# Altium footprint library connectors_headers.PcbLib: 60 footprints (part 2 of 4)
Each footprint in its own frame and in the unit in brackets; x right, y up, seen from the top. Pads: shape width x height; smd on the part's side, far side on the other; paste and mask are expansions set on the pad; w line width, h text height; cw(c..) or ccw(c..) is an arc to the next point about the centre after c.
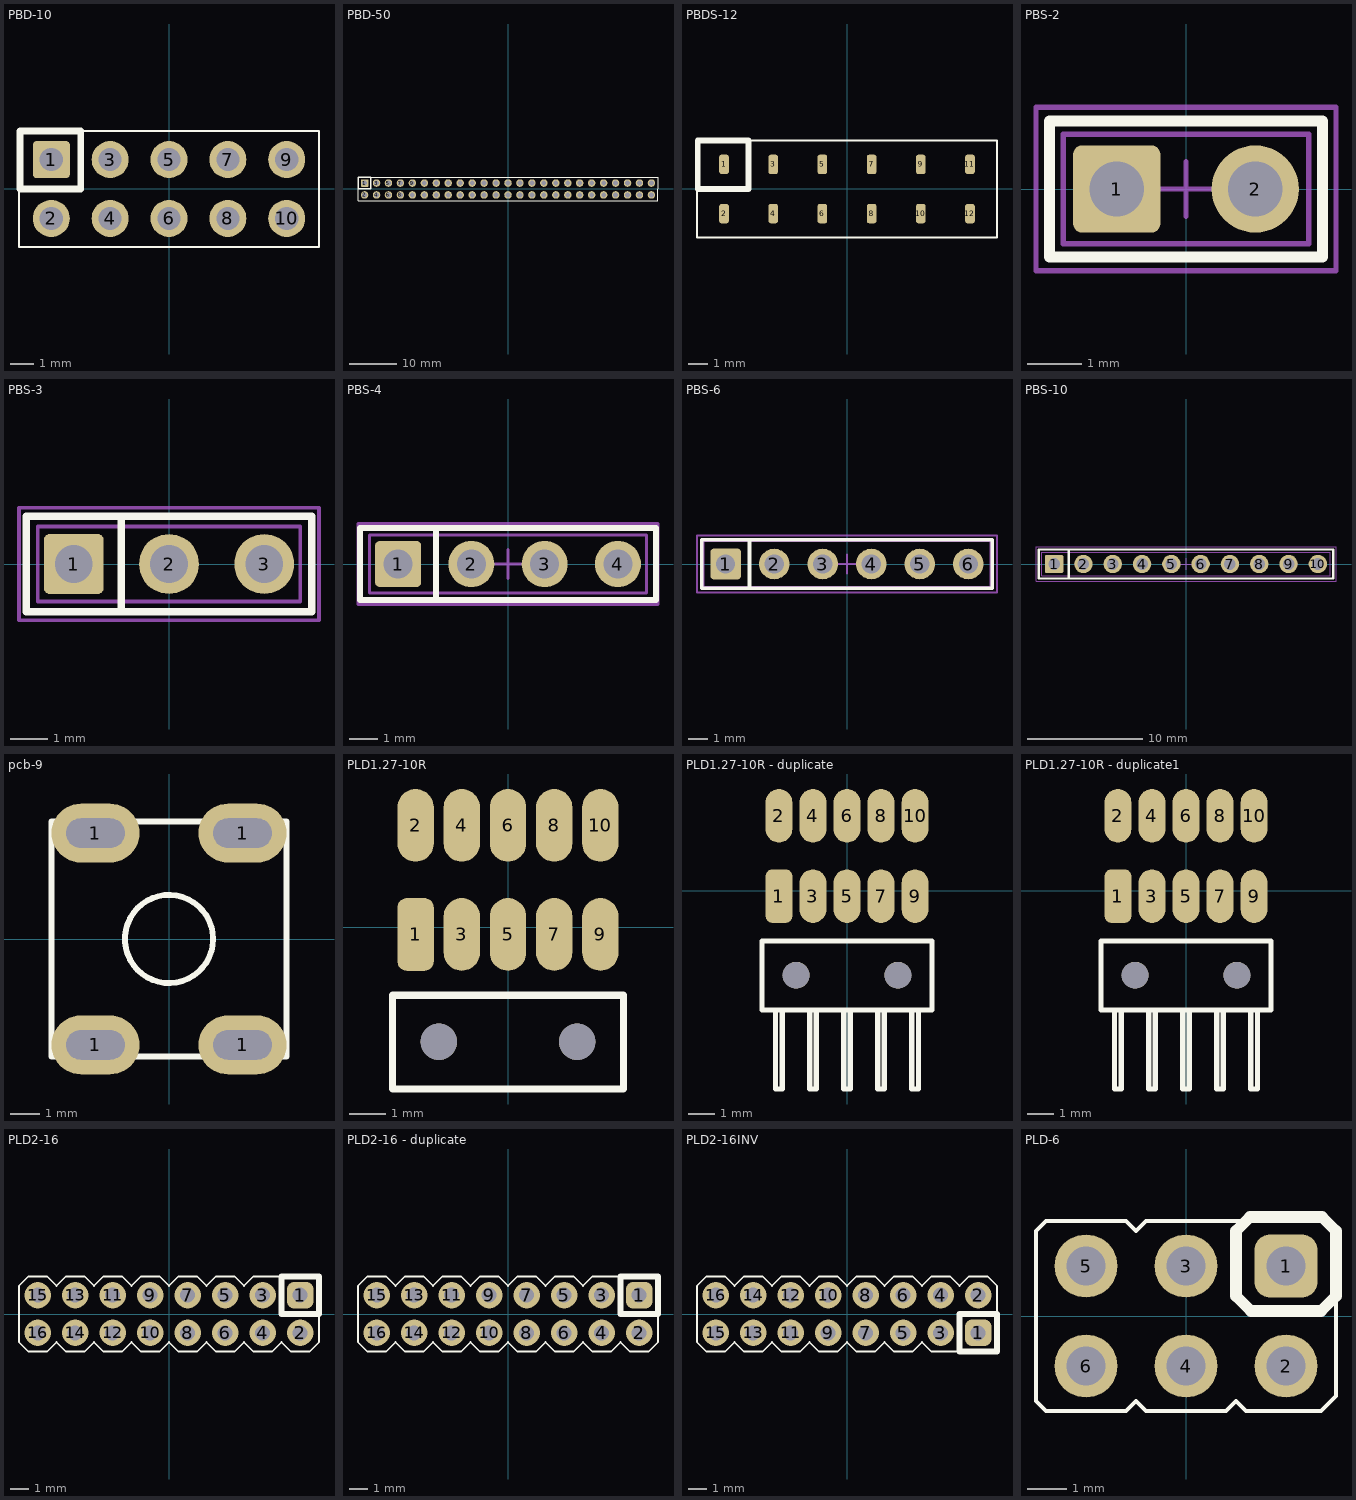
[diagram p1: the footprints below, top view; thin cyan lines are the x and y axes]

## PBD-10 [mm]
height 0.025
pads (10):
  rrect20% 1.6x1.6 hole 1 mask+0.127: 1(-5.08,1.27)
  round 1.6 hole 1 mask+0.127: 2(-5.08,-1.27) 3(-2.54,1.27) 4(-2.54,-1.27) 5(0,1.27) 6(0,-1.27) 7(2.54,1.27) 8(2.54,-1.27) 9(5.08,1.27) 10(5.08,-1.27)
Top Overlay:
  lines w0.1: -6.475,0 -6.475,-2.5 6.475,-2.5 6.475,2.5 -3.81,2.5
  lines w0.3: -6.44,0 -6.44,2.5 -3.81,2.5 -3.81,0 -6.44,0
3D body "PBD2_54-10.step": height 8.4, standoff -2.7, extent -6.35,-2.54 6.35,2.54

## PBD-50 [mm]
height 0.025
pads (50):
  rrect20% 1.6x1.6 hole 1 mask+0.127: 1(-30.48,1.27)
  round 1.6 hole 1 mask+0.127: 2(-30.48,-1.27) 3(-27.94,1.27) 4(-27.94,-1.27) 5(-25.4,1.27) 6(-25.4,-1.27) 7(-22.86,1.27) 8(-22.86,-1.27) 9(-20.32,1.27) 10(-20.32,-1.27) 11(-17.78,1.27) 12(-17.78,-1.27) 13(-15.24,1.27) 14(-15.24,-1.27) 15(-12.7,1.27) 16(-12.7,-1.27) 17(-10.16,1.27) 18(-10.16,-1.27) 19(-7.62,1.27) 20(-7.62,-1.27) 21(-5.08,1.27) 22(-5.08,-1.27) 23(-2.54,1.27) 24(-2.54,-1.27) 25(0,1.27) 26(0,-1.27) 27(2.54,1.27) 28(2.54,-1.27) 29(5.08,1.27) 30(5.08,-1.27) 31(7.62,1.27) 32(7.62,-1.27) 33(10.16,1.27) 34(10.16,-1.27) 35(12.7,1.27) 36(12.7,-1.27) 37(15.24,1.27) 38(15.24,-1.27) 39(17.78,1.27) 40(17.78,-1.27) 41(20.32,1.27) 42(20.32,-1.27) 43(22.86,1.27) 44(22.86,-1.27) 45(25.4,1.27) 46(25.4,-1.27) 47(27.94,1.27) 48(27.94,-1.27) 49(30.48,1.27) 50(30.48,-1.27)
Top Overlay:
  lines w0.1: -31.875,0 -31.875,-2.5 31.875,-2.5 31.875,2.5 -29.21,2.5 ; -6.35,2.5 3.935,2.5
  lines w0.3: -31.84,0 -29.21,0 -29.21,2.5 -31.84,2.5 -31.84,0
3D body "PBD2_54-10.step": height 8.4, standoff -2.7, extent 19.05,-2.54 31.75,2.54
3D body "PBD2_54-10.step": height 8.4, standoff -2.7, extent 6.35,-2.54 19.05,2.54
3D body "PBD2_54-10.step": height 8.4, standoff -2.7, extent -6.35,-2.54 6.35,2.54
3D body "PBD2_54-10.step": height 8.4, standoff -2.7, extent -19.05,-2.54 -6.35,2.54
3D body "PBD2_54-10.step": height 8.4, standoff -2.7, extent -31.75,-2.54 -19.05,2.54

## PBDS-12 [mm]
height 0.025
pads (12):
  rrect50% 0.5x1 all layers, no hole mask+0.127: 1(-6.35,1.27) 2(-6.35,-1.27) 3(-3.81,1.27) 4(-3.81,-1.27) 5(-1.27,1.27) 6(-1.27,-1.27) 7(1.27,1.27) 8(1.27,-1.27) 9(3.81,1.27) 10(3.81,-1.27) 11(6.35,1.27) 12(6.35,-1.27)
Top Overlay:
  lines w0.1: -7.745,0 -7.745,-2.5 7.745,-2.5 7.745,2.5 -5.08,2.5
  lines w0.3: -7.71,0 -5.08,0 -5.08,2.5 -7.71,2.5 -7.71,0

## PBS-2 [mm] "PBS-3 2.54"
height 0.025
pads (2):
  rrect20% 1.6x1.6 hole 1: 1(-1.27,0)
  round 1.6 hole 1: 2(1.27,0)
Top Overlay:
  lines w0.2: -2.5,-1.25 -2.5,1.25 2.5,1.25 2.5,-1.25 -2.5,-1.25
M3_comm_top:
  text ".comment" at -0.9,-0.3 h1
M5_asm_top:
  lines w0.1: -2.25,-1 2.25,-1 2.25,1 -2.25,1 -2.25,-1
  text ".Designator" at -1.5,1.25 h1
M7_courtyard_top:
  lines w0.1: -0.5,0 0.5,0 ; 0,-0.5 0,0.5 ; -2.75,-1.5 -2.75,1.5 2.75,1.5 2.75,-1.5 -2.75,-1.5
3D body "User Library-PBS-02.STEP": height 8.44, standoff -3.16, extent -2.54,-1.27 2.54,1.27

## PBS-3 [mm] "PBS-3 2.54"
height 0.025
pads (3):
  rrect20% 1.6x1.6 hole 1: 1(-2.54,0)
  round 1.6 hole 1: 2(0,0) 3(2.54,0)
Top Overlay:
  lines w0.2: -1.27,-1.27 -1.27,1.27 ; -3.81,-1.27 3.81,-1.27 3.81,1.27 -3.81,1.27 -3.81,-1.27
M3_comm_top:
  text ".comment" at -0.9,-0.3 h1
M5_asm_top:
  lines w0.1: -3.5,-1 3.5,-1 3.5,1 -3.5,1 -3.5,-1
  text ".Designator" at -1,1.3 h1
M7_courtyard_top:
  lines w0.1: -0.5,0 0.5,0 ; 0,-0.5 0,0.5 ; -4,-1.5 4,-1.5 4,1.5 -4,1.5 -4,-1.5
3D body "User Library-PBS-03.step": height 8.45, standoff -3.15, extent -3.81,-1.27 3.81,1.27

## PBS-4 [mm] "PBS-3 2.54"
height 0.025
pads (4):
  rrect20% 1.6x1.6 hole 1: 1(-3.81,0)
  round 1.6 hole 1: 2(-1.27,0) 3(1.27,0) 4(3.81,0)
Top Overlay:
  lines w0.2: -2.5,-1.2 -2.5,1.2 ; -5.13,-1.25 5.13,-1.25 5.13,1.25 -5.13,1.25 -5.13,-1.25
M3_comm_top:
  text ".comment" at -1.25,-0.3 h1
M5_asm_top:
  lines w0.1: -4.8,-1 4.8,-1 4.8,1 -4.8,1 -4.8,-1
  text ".Designator" at -1,1.3 h1
M7_courtyard_top:
  lines w0.1: -0.5,0 0.5,0 ; 0,-0.5 0,0.5 ; -5.2,-1.4 5.2,-1.4 5.2,1.4 -5.2,1.4 -5.2,-1.4
3D body "User Library-PBS-04.step": height 8.4, standoff -3.2, extent -5.075,-1.265 5.085,1.275

## PBS-6 [mm] "PBS-3 2.54"
height 0.025
pads (6):
  rrect20% 1.6x1.6 hole 1: 1(-6.35,0)
  round 1.6 hole 1: 2(-3.81,0) 3(-1.27,0) 4(1.27,0) 5(3.81,0) 6(6.35,0)
Top Overlay:
  lines w0.2: -5.1,-1.27 -5.1,1.27 ; -7.6,-1.27 7.6,-1.27 7.6,1.27 -7.6,1.27 -7.6,-1.27
M3_comm_top:
  text ".comment" at -1.25,-0.3 h1
M5_asm_top:
  lines w0.1: -7.5,-1.2 7.5,-1.2 7.5,1.2 -7.5,1.2 -7.5,-1.2
  text ".Designator" at -1.55,1.4 h1
M7_courtyard_top:
  lines w0.1: -0.5,0 0.5,0 ; 0,-0.5 0,0.5 ; -7.85,-1.5 7.85,-1.5 7.85,1.5 -2.05,1.5 -7.85,1.5 -7.85,-1.5
3D body "User Library-PBS-03.step": height 8.45, standoff -3.15, extent -7.62,-1.27 0,1.27
3D body "User Library-PBS-03.step": height 8.45, standoff -3.15, extent 0,-1.27 7.62,1.27

## PBS-10 [mm] "PBS-3 2.54"
height 0.025
pads (10):
  rrect20% 1.6x1.6 hole 1: 1(-11.43,0)
  round 1.6 hole 1: 2(-8.89,0) 3(-6.35,0) 4(-3.81,0) 5(-1.27,0) 6(1.27,0) 7(3.81,0) 8(6.35,0) 9(8.89,0) 10(11.43,0)
Top Overlay:
  lines w0.2: -10.15,-1.25 -10.15,1.25 ; -12.75,-1.25 -12.75,1.25 12.75,1.25 12.75,-1.25 -12.75,-1.25
M3_comm_top:
  text ".comment" at -1,-0.25 h1
M5_asm_top:
  lines w0.1: -12.5,-1 12.5,-1 12.5,1 -12.5,1 -12.5,-1
  text ".Designator" at -1.5,1.5 h1
M7_courtyard_top:
  lines w0.1: -0.5,0 0.5,0 ; 0,-0.5 0,0.5 ; -13,-1.5 -13,1.5 13,1.5 13,-1.5 -13,-1.5
3D body "User Library-PBS-10.step": height 8.4, standoff -3.2, extent -12.7,-1.27 12.7,1.27

## pcb-9 [mm] "COMPATIBLE_796861-4_796863-4_796859-4"
height 0.025
pads (4):
  oval 3x2 hole 1 slot 2 at 0 deg: 1(-2.5,3.6) 1(-2.5,-3.6) 1(2.5,-3.6) 1(2.5,3.6)
Top Overlay:
  circle w0.2: c0,0 r1.5
  lines w0.2: -4,-4 4,-4 4,4 -4,4 -4,-4
3D body "2-36195-3.stp": height 7.75, standoff 4.3, extent -3.339,-3.744 9.539,3.8
3D body "M3x0_5xL Phillips Panhead Screw.step": height 7.48, standoff 1.1, extent -2.8,-2.8 2.8,2.8
3D body: height 4.2, standoff 3.4, extent -4,-4 4,4
3D body: height 4.2, standoff -2.6, extent -3.3,-4 -1.7,-3.2
3D body: height 4.2, standoff -2.6, extent 1.7,-4 3.3,-3.2
3D body: height 4.2, standoff -2.6, extent 1.7,3.2 3.3,4
3D body: height 4.2, standoff -2.6, extent -3.3,3.2 -1.7,4
3D body: height 4.2, standoff 0.1, extent -4,-4 4,-3.1
3D body: height 4.2, standoff 0.1, extent -4,3.1 4,4

## PLD1.27-10R [mm] "FTSH-105-01-L-DH-A"
height 0.025
pads (12):
  rrect50% 1x2 smd: 1(-2.54,-0.2)
  oval 1x2 smd: 2(-2.54,2.8) 3(-1.27,-0.2) 4(-1.27,2.8) 5(0,-0.2) 6(0,2.8) 7(1.27,-0.2) 8(1.27,2.8) 9(2.54,-0.2) 10(2.54,2.8)
  round 1 hole 1 unplated: ""(-1.9,-3.15) ""(1.9,-3.15)
Top Overlay:
  lines w0.2: -3.175,-4.45 -3.175,-1.875 3.175,-1.875 3.175,-4.45 -3.175,-4.45
3D body "FTSH-105-01-L-DH-A.stp": height 3.44, standoff -1.01, extent -3.175,-7.463 3.175,3.434

## PLD1.27-10R - duplicate [mm] "FTSH-105-01-L-DH-A"
height 0.025
pads (12):
  rrect50% 1x2 smd: 1(-2.54,-0.2)
  oval 1x2 smd: 2(-2.54,2.8) 3(-1.27,-0.2) 4(-1.27,2.8) 5(0,-0.2) 6(0,2.8) 7(1.27,-0.2) 8(1.27,2.8) 9(2.54,-0.2) 10(2.54,2.8)
  round 1 hole 1 unplated: ""(-1.9,-3.15) ""(1.9,-3.15)
Top Overlay:
  lines w0.2: -2.667,-4.509 -2.667,-7.4 -2.413,-7.4 -2.413,-4.509 ; -1.397,-4.509 -1.397,-7.4 -1.143,-7.4 -1.143,-4.509 ; -0.127,-4.509 -0.127,-7.4 0.127,-7.4 0.127,-4.509 ; 1.143,-4.509 1.143,-7.4 1.397,-7.4 1.397,-4.509 ; 2.413,-4.509 2.413,-7.4 2.667,-7.4 2.667,-4.509 ; -3.175,-4.45 -3.175,-1.875 3.175,-1.875 3.175,-4.45 -3.175,-4.45
3D body "FTSH-105-01-L-DH-A.stp": height 3.44, standoff -1.01, extent -3.175,-7.463 3.175,3.434

## PLD1.27-10R - duplicate1 [mm] "FTSH-105-01-L-DH-A"
height 0.025
pads (12):
  rrect50% 1x2 smd: 1(-2.54,-0.2)
  oval 1x2 smd: 2(-2.54,2.8) 3(-1.27,-0.2) 4(-1.27,2.8) 5(0,-0.2) 6(0,2.8) 7(1.27,-0.2) 8(1.27,2.8) 9(2.54,-0.2) 10(2.54,2.8)
  round 1 hole 1 unplated: ""(-1.9,-3.15) ""(1.9,-3.15)
Top Overlay:
  lines w0.2: -2.667,-4.509 -2.667,-7.4 -2.413,-7.4 -2.413,-4.509 ; -1.397,-4.509 -1.397,-7.4 -1.143,-7.4 -1.143,-4.509 ; -0.127,-4.509 -0.127,-7.4 0.127,-7.4 0.127,-4.509 ; 1.143,-4.509 1.143,-7.4 1.397,-7.4 1.397,-4.509 ; 2.413,-4.509 2.413,-7.4 2.667,-7.4 2.667,-4.509 ; -3.175,-4.45 3.175,-4.45 3.175,-1.875 -3.175,-1.875 -3.175,-4.45
3D body "FTSH-105-01-L-DH-A.stp": height 3.44, standoff -1.01, extent -3.175,-7.463 3.175,3.434

## PLD2-16 [mm]
height 0.025
pads (16):
  rrect50% 1.4x1.4 hole 0.8 mask+0.127: 1(7,1)
  round 1.4 hole 0.8 mask+0.127: 2(7,-1) 3(5,1) 4(5,-1) 5(3,1) 6(3,-1) 7(1,1) 8(1,-1) 9(-1,1) 10(-1,-1) 11(-3,1) 12(-3,-1) 13(-5,1) 14(-5,-1) 15(-7,1) 16(-7,-1)
Top Overlay:
  lines w0.1: -8,-1.5 -7.5,-2 ; -8,-1.5 -8,1.5 -7.5,2 -6.5,2 -6,1.5 -5.5,2 -4.5,2 -4,1.5 -3.5,2 -2.5,2 -2,1.5 -1.5,2 -0.5,2 0,1.5 0.5,2 1.5,2 2,1.5 2.5,2 3.5,2 4,1.5 4.5,2 5.5,2 ; -8,-1.5 -7.5,-2 ; -7.5,-2 -6.5,-2 -6,-1.5 -5.5,-2 -4.5,-2 -4,-1.5 -3.5,-2 -2.5,-2 -2,-1.5 -1.5,-2 -0.5,-2 0,-1.5 0.5,-2 1.5,-2 2,-1.5 2.5,-2 3.5,-2 4,-1.5 4.5,-2 5.5,-2 6,-1.5 6.5,-2 7.5,-2 8,-1.5 8,2 ; 5.5,2 8,2 ; 5.5,2 8,2
  lines w0.3: 6,0 6,2 8,2 8,0 6,0
3D body "pld2-16.stp": height 6, standoff -2.8, extent -7.95,-2 7.95,2

## PLD2-16 - duplicate [mm]
height 0.025
pads (16):
  rrect50% 1.4x1.4 hole 0.8 mask+0.127: 1(7,1)
  round 1.4 hole 0.8 mask+0.127: 2(7,-1) 3(5,1) 4(5,-1) 5(3,1) 6(3,-1) 7(1,1) 8(1,-1) 9(-1,1) 10(-1,-1) 11(-3,1) 12(-3,-1) 13(-5,1) 14(-5,-1) 15(-7,1) 16(-7,-1)
Top Overlay:
  lines w0.1: -8,-1.5 -7.5,-2 ; -8,-1.5 -8,1.5 -7.5,2 -6.5,2 -6,1.5 -5.5,2 -4.5,2 -4,1.5 -3.5,2 -2.5,2 -2,1.5 -1.5,2 -0.5,2 0,1.5 0.5,2 1.5,2 2,1.5 2.5,2 3.5,2 4,1.5 4.5,2 5.5,2 ; -8,-1.5 -7.5,-2 ; -7.5,-2 -6.5,-2 -6,-1.5 -5.5,-2 -4.5,-2 -4,-1.5 -3.5,-2 -2.5,-2 -2,-1.5 -1.5,-2 -0.5,-2 0,-1.5 0.5,-2 1.5,-2 2,-1.5 2.5,-2 3.5,-2 4,-1.5 4.5,-2 5.5,-2 6,-1.5 6.5,-2 7.5,-2 8,-1.5 8,2 ; 5.5,2 8,2 ; 5.5,2 8,2
  lines w0.3: 6,0 8,0 8,2 6,2 6,0
3D body "pld2-16.stp": height 6, standoff -2.8, extent -7.95,-2 7.95,2

## PLD2-16INV [mm]
height 0.025
pads (16):
  rrect50% 1.4x1.4 hole 0.8 mask+0.127: 1(7,-1)
  round 1.4 hole 0.8 mask+0.127: 2(7,1) 3(5,-1) 4(5,1) 5(3,-1) 6(3,1) 7(1,-1) 8(1,1) 9(-1,-1) 10(-1,1) 11(-3,-1) 12(-3,1) 13(-5,-1) 14(-5,1) 15(-7,-1) 16(-7,1)
Top Overlay:
  lines w0.1: -8,-1.5 -7.5,-2 ; -8,-1.5 -8,1.5 -7.5,2 -6.5,2 -6,1.5 -5.5,2 -4.5,2 -4,1.5 -3.5,2 -2.5,2 -2,1.5 -1.5,2 -0.5,2 0,1.5 0.5,2 1.5,2 2,1.5 2.5,2 3.5,2 4,1.5 4.5,2 5.5,2 6,1.5 6.5,2 7.5,2 8,1.5 8,-2 ; -8,-1.5 -7.5,-2 ; -7.5,-2 -6.5,-2 -6,-1.5 -5.5,-2 -4.5,-2 -4,-1.5 -3.5,-2 -2.5,-2 -2,-1.5 -1.5,-2 -0.5,-2 0,-1.5 0.5,-2 1.5,-2 2,-1.5 2.5,-2 3.5,-2 4,-1.5 4.5,-2 5.5,-2 ; 5.5,-2 8,-2 ; 5.5,-2 8,-2
  lines w0.3: 6,-2 6,0 8,0 8,-2 6,-2
3D body "pld2-16.stp": height 6, standoff -2.8, extent -7.95,-2 7.95,2

## PLD-6 [mm]
height 0.025
pads (6):
  rrect50% 1.6x1.6 hole 1 mask+0.127: 1(2.54,1.27)
  round 1.6 hole 1 mask+0.127: 2(2.54,-1.27) 3(0,1.27) 4(0,-1.27) 5(-2.54,1.27) 6(-2.54,-1.27)
Top Overlay:
  lines w0.1: 1.397,2.413 -1.016,2.413 -1.27,2.159 -1.524,2.413 -3.556,2.413 -3.81,2.159 -3.81,-2.159 -3.556,-2.413 -1.524,-2.413 -1.27,-2.159 -1.016,-2.413 1.016,-2.413 1.27,-2.159 1.524,-2.413 3.429,-2.413 3.81,-2.032 3.81,0.381
  lines w0.3: 1.27,0.508 1.27,2.159 1.626,2.515 3.454,2.515 3.81,2.159 3.81,0.508 3.429,0.127 1.651,0.127 1.27,0.508
3D body "pld-6.STEP": height 8.7, standoff -2.4, extent -3.81,-2.54 3.81,2.54